# Altium footprint library PcbLib_ICs.PcbLib: 317 footprints (part 16 of 24) (continued)
## SLP2510P8 [mm] "Package for RClamp0524P"
height 0.43
pads (10):
  rect 0.675x0.25 smd paste+0 mask+0.02: 1(-0.437,1)
  rrect30% 0.675x0.25 smd paste+0 mask+0.02: 2(-0.437,0.5) 4(-0.437,-0.5) 5(-0.437,-1) 6(0.437,-1) 7(0.437,-0.5) 9(0.437,0.5) 10(0.437,1)
  rrect30% 0.675x0.4 smd paste+0 mask+0.02: 3(-0.437,0) 8(0.437,0)
Top Overlay:
  circle w0.2: c-1.092,1 r0.1
  lines w0.2: -0.5,-1.4 0.5,-1.4 ; -0.5,1.4 0.5,1.4
Top Solder:
  region: -0.15,0.22 0.15,0.22 0.15,-0.22 -0.15,-0.22
Top Assy:
  circle w0.05: c-0.33,1.08 r0.075
  lines w0.05: -0.5,-1.1 -0.51,-1.1 -0.51,-0.9 -0.5,-0.9 ; -0.5,-0.6 -0.51,-0.6 -0.51,-0.4 -0.5,-0.4 ; -0.5,-0.2 -0.51,-0.2 -0.51,0.2 -0.5,0.2 ; -0.5,0.4 -0.51,0.4 -0.51,0.6 -0.5,0.6 ; -0.5,0.9 -0.51,0.9 -0.51,1.1 -0.5,1.1 ; 0.5,-1.1 0.51,-1.1 0.51,-0.9 0.5,-0.9 ; 0.5,-0.6 0.51,-0.6 0.51,-0.4 0.5,-0.4 ; 0.5,-0.2 0.51,-0.2 0.51,0.2 0.5,0.2 ; 0.5,0.4 0.51,0.4 0.51,0.6 0.5,0.6 ; 0.5,0.9 0.51,0.9 0.51,1.1 0.5,1.1 ; -0.5,-1.25 0.5,-1.25 0.5,1.25 -0.5,1.25 -0.5,-1.25
  text ".Designator" at 0.233,-1.719 h1
Top Text:
  lines w0.1: -0.5,0 0.5,0 ; 0,-0.5 0,0.5
3D body "RClamp0524P.STEP": height 0.6, standoff 0.02, extent -0.51,-1.25 0.51,1.25

## SO8-HCPL [mm] "SO8-HCPL"
height 1.75
pads (8):
  rect 1.45x0.6 smd paste+0 mask+0.05: 1(-2.725,1.905)
  oval 1.45x0.6 smd paste+0 mask+0.05: 2(-2.725,0.635) 3(-2.725,-0.635) 4(-2.725,-1.905) 5(2.725,-1.905) 6(2.725,-0.635) 7(2.725,0.635) 8(2.725,1.905)
Top Overlay:
  circle w0.25: c-2.725,2.755 r0.125
  rectangle: -1.7,1.7 -0.9,2.5
  lines w0.2: -3.556,-1.27 -2.032,-1.27 ; -3.556,0 -2.032,0 ; -3.556,1.27 -2.032,1.27 ; -1.6,-2.5 1.6,-2.5 ; -1.6,2.5 1.6,2.5 ; 1.894,-1.27 3.418,-1.27 ; 1.894,0 3.418,0 ; 1.894,1.27 3.418,1.27
Top Assy:
  drawing of 332 lines, arcs and shapes, not listed
  text ".Designator" at 0.467,-3.443 h2
Top Text:
  lines w0.05: -3.7,-2.75 -3.7,2.75 3.7,2.75 3.7,-2.75 -3.7,-2.75
  lines w0.1: -0.5,0 0.5,0 ; 0,-0.5 0,0.5
3D body "User Library-SO8-HCPL.STEP": height 3.33, standoff -0.4, extent -3.003,-2.5 3.003,2.5

## SO-16W [mm] "SOIC, 16-Leads, Body 10.29x7.49mm, Pitch 1.27mm, IPC Medium Density"
height 2.64
pads (16):
  rect 2.1x0.7 smd paste+0 mask+0.05: 1(-4.75,4.445)
  oval 2.1x0.7 smd paste+0 mask+0.05: 2(-4.75,3.175) 3(-4.75,1.905) 4(-4.75,0.635) 5(-4.75,-0.635) 6(-4.75,-1.905) 7(-4.75,-3.175) 8(-4.75,-4.445) 9(4.75,-4.445) 10(4.75,-3.175) 11(4.75,-1.905) 12(4.75,-0.635) 13(4.75,0.635) 14(4.75,1.905) 15(4.75,3.175) 16(4.75,4.445)
Top Overlay:
  circle w0.25: c-4.75,5.295 r0.125
  rectangle: -3.4,4.45 -2.6,5.25
  lines w0.2: -5.842,-3.81 -3.4,-3.81 ; -5.842,-2.54 -3.4,-2.54 ; -5.842,-1.27 -3.4,-1.27 ; -5.842,0 -3.4,0 ; -5.842,1.27 -3.4,1.27 ; -5.842,2.54 -3.4,2.54 ; -5.842,3.81 -3.4,3.81 ; 3.4,-3.81 5.842,-3.81 ; 3.4,-2.54 5.842,-2.54 ; 3.4,-1.27 5.842,-1.27 ; 3.4,0 5.842,0 ; 3.4,1.27 5.842,1.27 ; 3.4,2.54 5.842,2.54 ; 3.4,3.81 5.842,3.81 ; -3.4,-5.25 -3.4,5.25 3.4,5.25 3.4,-5.25 -3.4,-5.25
Top Assy:
  drawing of 223 lines, arcs and shapes, not listed
  text ".Designator" at 0.467,-3.443 h2
Top Text:
  lines w0.05: -5.925,-5.5 -5.925,5.5 5.925,5.5 5.925,-5.5 -5.925,-5.5
  lines w0.1: -0.5,0 0.5,0 ; 0,-0.5 0,0.5
3D body "User Library-SO-16W.STEP": height 2.48, standoff 0, extent -5.155,-5.165 5.155,5.165

## SOIC-8 [mm] "SOIC-8 package"
height 1.75
pads (8):
  rect 1.45x0.6 smd paste+0 mask+0.05: 1(-2.725,1.905)
  oval 1.45x0.6 smd paste+0 mask+0.05: 2(-2.725,0.635) 3(-2.725,-0.635) 4(-2.725,-1.905) 5(2.725,-1.905) 6(2.725,-0.635) 7(2.725,0.635) 8(2.725,1.905)
Top Overlay:
  circle w0.25: c-2.725,2.755 r0.125
  rectangle: -1.7,1.7 -0.9,2.5
  lines w0.2: -3.556,-1.27 -1.601,-1.27 ; -3.556,0 -1.601,0 ; -3.556,1.27 -1.601,1.27 ; 1.601,-1.27 3.556,-1.27 ; 1.601,0 3.556,0 ; 1.601,1.27 3.556,1.27 ; -1.6,-2.5 -1.6,2.5 1.6,2.5 1.6,-2.5 -1.6,-2.5
Top Assy:
  circle w0.05: c-1.225,1.784 r0.216
  lines w0.05: -2.889,-2.121 -2.502,-2.121 ; -2.889,-2.121 -2.889,-1.715 ; -2.889,-2.121 -2.889,-1.715 ; -2.889,-2.121 -1.867,-2.121 ; -2.889,-1.715 -2.502,-1.715 ; -2.889,-1.715 -1.867,-1.715 ; -2.889,-0.851 -2.502,-0.851 ; -2.889,-0.851 -2.889,-0.445 ; -2.889,-0.851 -2.889,-0.445 ; -2.889,-0.851 -1.867,-0.851 ; -2.889,-0.445 -2.502,-0.445 ; -2.889,-0.445 -1.867,-0.445 ; -2.889,0.419 -2.502,0.419 ; -2.889,0.419 -2.889,0.826 ; -2.889,0.419 -2.889,0.826 ; -2.889,0.419 -1.867,0.419 ; -2.889,0.826 -2.502,0.825 ; -2.889,0.826 -1.867,0.825 ; -2.889,1.689 -2.502,1.689 ; -2.889,1.689 -2.889,2.095 ; -2.889,1.689 -2.889,2.095 ; -2.889,1.689 -1.867,1.689 ; -2.889,2.095 -2.502,2.095 ; -2.889,2.095 -1.867,2.095 ; -2.502,-2.121 -2.502,-1.715 ; -2.502,-2.121 -2.261,-2.121 ; -2.502,-1.715 -2.261,-1.715 ; -2.502,-0.851 -2.502,-0.445 ; -2.502,-0.851 -2.261,-0.851 ; -2.502,-0.445 -2.261,-0.445 ; -2.502,0.419 -2.502,0.825 ; -2.502,0.419 -2.261,0.419 ; -2.502,0.825 -2.261,0.826 ; -2.502,1.689 -2.502,2.095 ; -2.502,1.689 -2.261,1.689 ; -2.502,2.095 -2.261,2.095 ; -2.261,-2.121 -2.261,-1.715 ; -2.261,-2.121 -2.019,-2.121 ; -2.261,-1.715 -2.019,-1.715 ; -2.261,-0.851 -2.261,-0.445 ; -2.261,-0.851 -2.019,-0.851 ; -2.261,-0.445 -2.019,-0.445 ; -2.261,0.419 -2.261,0.826 ; -2.261,0.419 -2.019,0.419 ; -2.261,0.826 -2.019,0.825 ; -2.261,1.689 -2.261,2.095 ; -2.261,1.689 -2.019,1.689 ; -2.261,2.095 -2.019,2.095 ; -2.019,-2.121 -2.019,-1.715 ; -2.019,-2.121 -1.867,-2.121 ; -2.019,-1.715 -1.867,-1.715 ; -2.019,-0.851 -2.019,-0.445 ; -2.019,-0.851 -1.867,-0.851 ; -2.019,-0.445 -1.867,-0.445 ; -2.019,0.419 -2.019,0.825 ; -2.019,0.419 -1.867,0.419 ; -2.019,0.825 -1.867,0.825 ; -2.019,1.689 -2.019,2.095 ; -2.019,1.689 -1.867,1.689 ; -2.019,2.095 -1.867,2.095 ; -1.867,-2.451 1.867,-2.451 ; -1.867,-2.451 -1.682,-2.266 ; -1.867,-2.451 -1.867,2.451 ; -1.867,-2.451 -1.867,-2.121 ; -1.867,-2.451 1.867,-2.451 ; -1.867,-1.715 -1.867,-0.851 ; -1.867,-0.445 -1.867,0.419 ; -1.867,0.825 -1.867,1.689 ; -1.867,2.095 -1.867,2.451 ; -1.867,2.451 1.867,2.451 ; -1.867,2.451 -1.682,2.266 ; -1.867,2.451 1.867,2.451 ; -1.682,-2.266 1.682,-2.266 ; -1.682,-2.266 -1.682,2.266 ; -1.682,2.266 1.682,2.266 ; 1.682,-2.266 1.867,-2.451 ; 1.682,-2.266 1.682,2.266 ; 1.682,2.266 1.867,2.451 ; 1.867,-2.451 1.867,2.451 ; 1.867,-2.451 1.867,-2.121 ; 1.867,-2.121 2.019,-2.121 ; 1.867,-2.121 2.889,-2.121 ; 1.867,-1.715 2.019,-1.715 ; 1.867,-1.715 2.889,-1.715 ; 1.867,-1.715 1.867,-0.851 ; 1.867,-0.851 2.019,-0.851 ; 1.867,-0.851 2.889,-0.851 ; 1.867,-0.445 2.019,-0.445 ; 1.867,-0.445 2.889,-0.445 ; 1.867,-0.445 1.867,0.419 ; 1.867,0.419 2.019,0.419 ; 1.867,0.419 2.889,0.419 ; 1.867,0.825 2.019,0.826 ; 1.867,0.825 2.889,0.825 ; 1.867,0.825 1.867,1.689 ; 1.867,1.689 2.019,1.689 ; 1.867,1.689 2.889,1.689 ; 1.867,2.095 2.019,2.095 ; 1.867,2.095 2.889,2.095 ; 1.867,2.095 1.867,2.451 ; 2.019,-2.121 2.019,-1.715 ; 2.019,-2.121 2.261,-2.121 ; 2.019,-1.715 2.261,-1.715 ; 2.019,-0.851 2.019,-0.445 ; 2.019,-0.851 2.261,-0.851 ; 2.019,-0.445 2.261,-0.445 ; 2.019,0.419 2.019,0.826 ; 2.019,0.419 2.261,0.419 ; 2.019,0.826 2.261,0.826 ; 2.019,1.689 2.019,2.095 ; 2.019,1.689 2.261,1.689 ; 2.019,2.095 2.261,2.095 ; 2.261,-2.121 2.502,-2.121 ; 2.261,-2.121 2.261,-1.715 ; 2.261,-1.715 2.502,-1.715 ; 2.261,-0.851 2.502,-0.851 ; 2.261,-0.851 2.261,-0.445 ; 2.261,-0.445 2.502,-0.445 ; 2.261,0.419 2.502,0.419 ; 2.261,0.419 2.261,0.826 ; 2.261,0.826 2.502,0.825 ; 2.261,1.689 2.502,1.689 ; 2.261,1.689 2.261,2.095 ; 2.261,2.095 2.502,2.095 ; 2.502,-2.121 2.502,-1.715 ; 2.502,-2.121 2.889,-2.121 ; 2.502,-1.715 2.889,-1.715 ; 2.502,-0.851 2.502,-0.445 ; 2.502,-0.851 2.889,-0.851 ; 2.502,-0.445 2.889,-0.445 ; 2.502,0.419 2.502,0.825 ; 2.502,0.419 2.889,0.419 ; 2.502,0.825 2.889,0.825 ; 2.502,1.689 2.502,2.095 ; 2.502,1.689 2.889,1.689 ; 2.502,2.095 2.889,2.095 ; 2.889,-2.121 2.889,-1.715 ; 2.889,-2.121 2.889,-1.715 ; 2.889,-0.851 2.889,-0.445 ; 2.889,-0.851 2.889,-0.445 ; 2.889,0.419 2.889,0.825 ; 2.889,0.419 2.889,0.825 ; 2.889,1.689 2.889,2.095 ; 2.889,1.689 2.889,2.095
  text ".Designator" at 0.467,-3.443 h2
Top Text:
  lines w0.05: -3.7,-2.75 3.7,-2.75 3.7,2.75 -3.7,2.75 -3.7,-2.75
  lines w0.1: -0.5,0 0.5,0 ; 0,-0.5 0,0.5
3D body "User Library-SOIC-8-1.step": height 1.75, standoff 0, extent -3,-2.45 3,2.45

## SOIC-8-WIDE [mm] "SOIC, 8-Leads, Body 4.50x4.50mm, Pitch 1.27mm, Thermal Pad 4.20x4.20mm, IPC Medium Density"
height 1.77
pads (8):
  rect 1.5x0.6 smd paste+0 mask+0.05: 1(-3.925,1.9)
  oval 1.5x0.6 smd paste+0 mask+0.05: 2(-3.925,0.63) 3(-3.925,-0.64) 4(-3.925,-1.91) 5(3.943,-1.91) 6(3.943,-0.64) 7(3.943,0.63) 8(3.943,1.9)
Top Overlay:
  circle w0.25: c-4.175,2.755 r0.125
  rectangle: -2.5,1.7 -1.7,2.5
  lines w0.2: -4.7,-1.275 -2.9,-1.275 ; -4.7,-0.005 -2.9,-0.005 ; -4.7,1.265 -2.9,1.265 ; -3,-2.475 -3,-3 3,-3 3,-2.475 ; -3,2.475 -3,3 3,3 3,2.475 ; 2.918,-1.275 4.718,-1.275 ; 2.918,-0.005 4.718,-0.005 ; 2.918,1.265 4.718,1.265
Top Assy:
  drawing of 152 lines, arcs and shapes, not listed
  text ".Designator" at 0.467,-3.443 h2
Top Text:
  lines w0.1: -0.5,0 0.5,0 ; 0,-0.5 0,0.5
3D body "User Library-SOIC8_Wide_5mmx5mm.step": height 1.75, standoff -0.01, extent -4.005,-2.74 4.097,2.72

## SOIC-8-WIDE_WITH_SOIC-16N [mm] "SOIC, 8-Leads, Body 4.50x4.50mm, Pitch 1.27mm, Thermal Pad 4.20x4.20mm, IPC Medium Density with SOIC 16-Leads, Body 10.29x7.49mm, Pitch 1.27mm, IPC Medium Density"
height 2.64
pads (24):
  oval 1.9x0.6 smd paste+0 mask+0.05: 1(-4.75,-3.175) 2(-4.75,-4.445) 3(4.75,-4.445) 4(4.75,-3.175) 5(4.75,3.175) 6(4.75,4.445) 8(-4.75,3.175) DNU(-4.75,-1.905) DNU(-4.75,-0.635) DNU(-4.75,0.635) DNU(-4.75,1.905) DNU(4.75,-1.905) DNU(4.75,-0.635) DNU(4.75,0.635) DNU(4.75,1.905)
  rect 0.6x1.5 smd paste+0 mask+0.05: 1(-1.9,-3.925)
  oval 0.6x1.5 smd paste+0 mask+0.05: 2(-0.63,-3.925) 3(0.64,-3.925) 4(1.91,-3.925) 5(1.91,3.943) 6(0.64,3.943) 7(-0.63,3.943) 8(-1.9,3.943)
  rect 1.9x0.6 smd paste+0 mask+0.05: 7(-4.75,4.445)
Top Overlay:
  circle w0.25: c-2.755,-4.175 r0.125
  circle w0.25: c-4.75,5.295 r0.125
  rectangle: -3.4,4.45 -2.6,5.25
  region: -2.4,-3 -2.4,-2.4 -3,-2.4 -3,-3
  lines w0.2: -5.65,-3.81 -3.4,-3.81 ; -5.65,-2.54 -3.4,-2.54 ; -5.65,-1.27 -3.4,-1.27 ; -5.65,0 -3.4,0 ; -5.65,1.27 -3.4,1.27 ; -5.65,2.54 -3.4,2.54 ; -5.65,3.81 -3.4,3.81 ; -2.475,-3 -3,-3 -3,3 -2.475,3 ; -1.265,-4.7 -1.265,-2.9 ; -1.265,2.918 -1.265,4.718 ; 0.005,-4.7 0.005,-2.9 ; 0.005,2.918 0.005,4.718 ; 1.275,-4.7 1.275,-2.9 ; 1.275,2.918 1.275,4.718 ; 2.475,-3 3,-3 3,3 2.475,3 ; 3.4,-3.81 5.65,-3.81 ; 3.4,-2.54 5.65,-2.54 ; 3.4,-1.27 5.65,-1.27 ; 3.4,0 5.65,0 ; 3.4,1.27 5.65,1.27 ; 3.4,2.54 5.65,2.54 ; 3.4,3.81 5.65,3.81 ; -3.4,-5.25 3.4,-5.25 3.4,5.25 -3.4,5.25 -3.4,-5.25
Top Assy:
  drawing of 365 lines, arcs and shapes, not listed
  text ".Designator" at -3.443,-0.467 h2
Top Text:
  lines w0.05: -5.925,-5.5 5.925,-5.5 5.925,5.5 -5.925,5.5 -5.925,-5.5
  lines w0.1: -0.5,0 0.5,0 -0.5,0 ; 0,-0.5 0,0.5 0,-0.5
3D body "User Library-SOIC8_Wide_5mmx5mm.step": height 1.75, standoff -0.01, extent -2.72,-4.005 2.74,4.097

## SOIC-8_with_DIP-8 [mm] "Plastic DIP, 8 pin, lead pitch 2.54mm (0.1\"), row spacing 7.62mm (0.3\")."
height 1.75
pads (16):
  rect 2x1.5 hole 0.8 mask+0.075: 1(-3.81,3.81)
  rect 0.6x1.45 smd paste+0 mask+0.05: 1(1.905,2.725)
  oval 2x1.5 hole 0.8 mask+0.075: 2(-3.81,1.27) 3(-3.81,-1.27) 4(-3.81,-3.81) 5(3.81,-3.81) 6(3.81,-1.27) 7(3.81,1.27) 8(3.81,3.81)
  oval 0.6x1.45 smd paste+0 mask+0.05: 2(0.635,2.725) 3(-0.635,2.725) 4(-1.905,2.725) 5(-1.905,-2.725) 6(-0.635,-2.725) 7(0.635,-2.725) 8(1.905,-2.725)
Top Overlay:
  circle w0.25: c2.755,2.725 r0.125
  circle w0.6: c-4,5.75 r0.3
  region: 1.45,1.6 1.45,0.8 2.25,0.8 2.25,1.6
  lines w0.2: -2.2,-3.8 -2.2,-4.8 2.2,-4.8 2.2,-3.8 ; -2.2,3.8 -2.2,4.8 2.2,4.8 2.2,3.8 ; -1.27,-3.403 -1.27,-1.603 ; -1.27,1.603 -1.27,3.403 ; -1.016,4.8 ccw(c0,4.8) 1.016,4.8 ; 0,-3.403 0,-1.603 ; 0,1.603 0,3.403 ; 1.27,-3.403 1.27,-1.603 ; 1.27,1.603 1.27,3.403 ; -2.25,-1.6 2.25,-1.6 2.25,1.6 -2.25,1.6 -2.25,-1.6
Top Assy:
  circle w0.05: c1.784,1.225 r0.216
  lines w0.05: -2.451,-1.867 -2.451,1.867 ; -2.451,-1.867 -2.266,-1.682 ; -2.451,-1.867 2.451,-1.867 ; -2.451,-1.867 -2.451,1.867 ; -2.451,-1.867 -2.121,-1.867 ; -2.451,1.867 -2.266,1.682 ; -2.451,1.867 2.451,1.867 ; -2.451,1.867 -2.121,1.867 ; -2.266,-1.682 -2.266,1.682 ; -2.266,-1.682 2.266,-1.682 ; -2.266,1.682 2.266,1.682 ; -2.121,-2.889 -2.121,-2.502 ; -2.121,-2.889 -1.715,-2.889 ; -2.121,-2.889 -2.121,-1.867 ; -2.121,-2.889 -1.715,-2.889 ; -2.121,-2.502 -1.715,-2.502 ; -2.121,-2.502 -2.121,-2.261 ; -2.121,-2.261 -2.121,-2.019 ; -2.121,-2.261 -1.715,-2.261 ; -2.121,-2.019 -1.715,-2.019 ; -2.121,-2.019 -2.121,-1.867 ; -2.121,1.867 -2.121,2.019 ; -2.121,1.867 -2.121,2.889 ; -2.121,2.019 -1.715,2.019 ; -2.121,2.019 -2.121,2.261 ; -2.121,2.261 -2.121,2.502 ; -2.121,2.261 -1.715,2.261 ; -2.121,2.502 -1.715,2.502 ; -2.121,2.502 -2.121,2.889 ; -2.121,2.889 -1.715,2.889 ; -2.121,2.889 -1.715,2.889 ; -1.715,-2.889 -1.715,-2.502 ; -1.715,-2.889 -1.715,-1.867 ; -1.715,-2.502 -1.715,-2.261 ; -1.715,-2.261 -1.715,-2.019 ; -1.715,-2.019 -1.715,-1.867 ; -1.715,-1.867 -0.851,-1.867 ; -1.715,1.867 -1.715,2.019 ; -1.715,1.867 -0.851,1.867 ; -1.715,1.867 -1.715,2.889 ; -1.715,2.019 -1.715,2.261 ; -1.715,2.261 -1.715,2.502 ; -1.715,2.502 -1.715,2.889 ; -0.851,-2.889 -0.851,-2.502 ; -0.851,-2.889 -0.445,-2.889 ; -0.851,-2.889 -0.445,-2.889 ; -0.851,-2.889 -0.851,-1.867 ; -0.851,-2.502 -0.445,-2.502 ; -0.851,-2.502 -0.851,-2.261 ; -0.851,-2.261 -0.851,-2.019 ; -0.851,-2.261 -0.445,-2.261 ; -0.851,-2.019 -0.445,-2.019 ; -0.851,-2.019 -0.851,-1.867 ; -0.851,1.867 -0.851,2.019 ; -0.851,1.867 -0.851,2.889 ; -0.851,2.019 -0.445,2.019 ; -0.851,2.019 -0.851,2.261 ; -0.851,2.261 -0.851,2.502 ; -0.851,2.261 -0.445,2.261 ; -0.851,2.502 -0.445,2.502 ; -0.851,2.502 -0.851,2.889 ; -0.851,2.889 -0.445,2.889 ; -0.851,2.889 -0.445,2.889 ; -0.445,-2.889 -0.445,-2.502 ; -0.445,-2.889 -0.445,-1.867 ; -0.445,-2.502 -0.445,-2.261 ; -0.445,-2.261 -0.445,-2.019 ; -0.445,-2.019 -0.445,-1.867 ; -0.445,-1.867 0.419,-1.867 ; -0.445,1.867 -0.445,2.019 ; -0.445,1.867 0.419,1.867 ; -0.445,1.867 -0.445,2.889 ; -0.445,2.019 -0.445,2.261 ; -0.445,2.261 -0.445,2.502 ; -0.445,2.502 -0.445,2.889 ; 0.419,-2.889 0.419,-2.502 ; 0.419,-2.889 0.825,-2.889 ; 0.419,-2.889 0.419,-1.867 ; 0.419,-2.889 0.825,-2.889 ; 0.419,-2.502 0.825,-2.502 ; 0.419,-2.502 0.419,-2.261 ; 0.419,-2.261 0.419,-2.019 ; 0.419,-2.261 0.825,-2.261 ; 0.419,-2.019 0.825,-2.019 ; 0.419,-2.019 0.419,-1.867 ; 0.419,1.867 0.419,2.019 ; 0.419,1.867 0.419,2.889 ; 0.419,2.019 0.825,2.019 ; 0.419,2.019 0.419,2.261 ; 0.419,2.261 0.419,2.502 ; 0.419,2.261 0.825,2.261 ; 0.419,2.502 0.825,2.502 ; 0.419,2.502 0.419,2.889 ; 0.419,2.889 0.825,2.889 ; 0.419,2.889 0.825,2.889 ; 0.825,-2.889 0.825,-2.502 ; 0.825,-2.889 0.825,-1.867 ; 0.825,-2.502 0.825,-2.261 ; 0.825,-2.261 0.825,-2.019 ; 0.825,-2.019 0.825,-1.867 ; 0.825,-1.867 1.689,-1.867 ; 0.825,1.867 0.825,2.019 ; 0.825,1.867 1.689,1.867 ; 0.825,1.867 0.825,2.889 ; 0.825,2.019 0.825,2.261 ; 0.825,2.261 0.825,2.502 ; 0.825,2.502 0.825,2.889 ; 1.689,-2.889 1.689,-2.502 ; 1.689,-2.889 2.095,-2.889 ; 1.689,-2.889 2.095,-2.889 ; 1.689,-2.889 1.689,-1.867 ; 1.689,-2.502 2.095,-2.502 ; 1.689,-2.502 1.689,-2.261 ; 1.689,-2.261 1.689,-2.019 ; 1.689,-2.261 2.095,-2.261 ; 1.689,-2.019 2.095,-2.019 ; 1.689,-2.019 1.689,-1.867 ; 1.689,1.867 1.689,2.019 ; 1.689,1.867 1.689,2.889 ; 1.689,2.019 2.095,2.019 ; 1.689,2.019 1.689,2.261 ; 1.689,2.261 1.689,2.502 ; 1.689,2.261 2.095,2.261 ; 1.689,2.502 2.095,2.502 ; 1.689,2.502 1.689,2.889 ; 1.689,2.889 2.095,2.889 ; 1.689,2.889 2.095,2.889 ; 2.095,-2.889 2.095,-2.502 ; 2.095,-2.889 2.095,-1.867 ; 2.095,-2.502 2.095,-2.261 ; 2.095,-2.261 2.095,-2.019 ; 2.095,-2.019 2.095,-1.867 ; 2.095,-1.867 2.451,-1.867 ; 2.095,1.867 2.095,2.019 ; 2.095,1.867 2.451,1.867 ; 2.095,1.867 2.095,2.889 ; 2.095,2.019 2.095,2.261 ; 2.095,2.261 2.095,2.502 ; 2.095,2.502 2.095,2.889 ; 2.266,-1.682 2.266,1.682 ; 2.266,-1.682 2.451,-1.867 ; 2.266,1.682 2.451,1.867 ; 2.451,-1.867 2.451,1.867 ; 2.451,-1.867 2.451,1.867
  text ".Designator" at -3.443,-0.467 h2
Top Text:
  lines w0.05: -5.334,-5 5.334,-5 5.334,5 -5.334,5 -5.334,-5
  lines w0.1: -0.5,0 0.5,0 ; 0,-0.5 0,0.5
3D body "User Library-SOIC-8-1.step": height 1.75, standoff 0, extent -2.45,-3 2.45,3

## SOIC-8EP [mm] "SOIC-8 package with exponsed pad"
height 1.75
pads (9):
  rect 1.45x0.6 smd paste+0 mask+0.05: 1(-2.725,1.905)
  oval 1.45x0.6 smd paste+0 mask+0.05: 2(-2.725,0.635) 3(-2.725,-0.635) 4(-2.725,-1.905) 5(2.725,-1.905) 6(2.725,-0.635) 7(2.725,0.635) 8(2.725,1.905)
  rrect10% 2.56x3.45 smd paste-50 mask+0.05: EP(0,0)
Top Overlay:
  circle w0.25: c-2.725,2.755 r0.125
  lines w0.2: -3.5,-1.27 -1.7,-1.27 ; -3.5,0 -1.7,0 ; -3.5,1.27 -1.7,1.27 ; 1.7,-1.27 3.5,-1.27 ; 1.7,0 3.5,0 ; 1.7,1.27 3.5,1.27 ; -1.7,-2.5 1.7,-2.5 1.7,2.5 -1.7,2.5 -1.7,-2.5
Top Paste:
  region: -0.8,-1.15 -1.3,-1.15 -1.3,-1.65 -0.8,-1.65
  region: 0.6,-1.15 0.1,-1.15 0.1,-1.65 0.6,-1.65
  rectangle: -0.6,-1.65 -0.1,-1.15
  region: 1.3,-1.15 0.8,-1.15 0.8,-1.65 1.3,-1.65
  region: -0.8,-0.45 -1.3,-0.45 -1.3,-0.95 -0.8,-0.95
  region: 0.6,-0.45 0.1,-0.45 0.1,-0.95 0.6,-0.95
  rectangle: -0.6,-0.95 -0.1,-0.45
  region: 1.3,-0.45 0.8,-0.45 0.8,-0.95 1.3,-0.95
  rectangle: 0.8,1.15 1.3,1.65
  rectangle: -0.6,1.15 -0.1,1.65
  region: 0.6,1.65 0.1,1.65 0.1,1.15 0.6,1.15
  rectangle: -1.3,1.15 -0.8,1.65
  rectangle: 0.8,0.45 1.3,0.95
  rectangle: -0.6,0.45 -0.1,0.95
  region: 0.6,0.95 0.1,0.95 0.1,0.45 0.6,0.45
  rectangle: -1.3,0.45 -0.8,0.95
  rectangle: 0.8,-0.25 1.3,0.25
  rectangle: -0.6,-0.25 -0.1,0.25
  region: 0.6,0.25 0.1,0.25 0.1,-0.25 0.6,-0.25
  rectangle: -1.3,-0.25 -0.8,0.25
Top Assy:
  circle w0.05: c-1.225,1.784 r0.216
  lines w0.05: -2.889,-2.121 -1.867,-2.121 ; -2.889,-2.121 -2.889,-1.715 ; -2.889,-2.121 -2.889,-1.715 ; -2.889,-2.121 -2.502,-2.121 ; -2.889,-1.715 -1.867,-1.715 ; -2.889,-1.715 -2.502,-1.715 ; -2.889,-0.851 -1.867,-0.851 ; -2.889,-0.851 -2.889,-0.445 ; -2.889,-0.851 -2.889,-0.445 ; -2.889,-0.851 -2.502,-0.851 ; -2.889,-0.445 -1.867,-0.445 ; -2.889,-0.445 -2.502,-0.445 ; -2.889,0.419 -1.867,0.419 ; -2.889,0.419 -2.889,0.826 ; -2.889,0.419 -2.889,0.826 ; -2.889,0.419 -2.502,0.419 ; -2.889,0.826 -1.867,0.825 ; -2.889,0.826 -2.502,0.825 ; -2.889,1.689 -1.867,1.689 ; -2.889,1.689 -2.889,2.095 ; -2.889,1.689 -2.889,2.095 ; -2.889,1.689 -2.502,1.689 ; -2.889,2.095 -1.867,2.095 ; -2.889,2.095 -2.502,2.095 ; -2.502,-2.121 -2.261,-2.121 ; -2.502,-2.121 -2.502,-1.715 ; -2.502,-1.715 -2.261,-1.715 ; -2.502,-0.851 -2.261,-0.851 ; -2.502,-0.851 -2.502,-0.445 ; -2.502,-0.445 -2.261,-0.445 ; -2.502,0.419 -2.261,0.419 ; -2.502,0.419 -2.502,0.825 ; -2.502,0.825 -2.261,0.826 ; -2.502,1.689 -2.261,1.689 ; -2.502,1.689 -2.502,2.095 ; -2.502,2.095 -2.261,2.095 ; -2.261,-2.121 -2.019,-2.121 ; -2.261,-2.121 -2.261,-1.715 ; -2.261,-1.715 -2.019,-1.715 ; -2.261,-0.851 -2.019,-0.851 ; -2.261,-0.851 -2.261,-0.445 ; -2.261,-0.445 -2.019,-0.445 ; -2.261,0.419 -2.019,0.419 ; -2.261,0.419 -2.261,0.826 ; -2.261,0.826 -2.019,0.825 ; -2.261,1.689 -2.019,1.689 ; -2.261,1.689 -2.261,2.095 ; -2.261,2.095 -2.019,2.095 ; -2.019,-2.121 -1.867,-2.121 ; -2.019,-2.121 -2.019,-1.715 ; -2.019,-1.715 -1.867,-1.715 ; -2.019,-0.851 -1.867,-0.851 ; -2.019,-0.851 -2.019,-0.445 ; -2.019,-0.445 -1.867,-0.445 ; -2.019,0.419 -1.867,0.419 ; -2.019,0.419 -2.019,0.825 ; -2.019,0.825 -1.867,0.825 ; -2.019,1.689 -1.867,1.689 ; -2.019,1.689 -2.019,2.095 ; -2.019,2.095 -1.867,2.095 ; -1.867,-2.451 1.867,-2.451 ; -1.867,-2.451 -1.867,-2.121 ; -1.867,-2.451 -1.867,2.451 ; -1.867,-2.451 -1.682,-2.266 ; -1.867,-2.451 1.867,-2.451 ; -1.867,-1.715 -1.867,-0.851 ; -1.867,-0.445 -1.867,0.419 ; -1.867,0.825 -1.867,1.689 ; -1.867,2.095 -1.867,2.451 ; -1.867,2.451 1.867,2.451 ; -1.867,2.451 -1.682,2.266 ; -1.867,2.451 1.867,2.451 ; -1.682,-2.266 -1.682,2.266 ; -1.682,-2.266 1.682,-2.266 ; -1.682,2.266 1.682,2.266 ; 1.682,-2.266 1.682,2.266 ; 1.682,-2.266 1.867,-2.451 ; 1.682,2.266 1.867,2.451 ; 1.867,-2.451 1.867,-2.121 ; 1.867,-2.451 1.867,2.451 ; 1.867,-2.121 2.889,-2.121 ; 1.867,-2.121 2.019,-2.121 ; 1.867,-1.715 1.867,-0.851 ; 1.867,-1.715 2.889,-1.715 ; 1.867,-1.715 2.019,-1.715 ; 1.867,-0.851 2.889,-0.851 ; 1.867,-0.851 2.019,-0.851 ; 1.867,-0.445 1.867,0.419 ; 1.867,-0.445 2.889,-0.445 ; 1.867,-0.445 2.019,-0.445 ; 1.867,0.419 2.889,0.419 ; 1.867,0.419 2.019,0.419 ; 1.867,0.825 1.867,1.689 ; 1.867,0.825 2.889,0.825 ; 1.867,0.825 2.019,0.826 ; 1.867,1.689 2.889,1.689 ; 1.867,1.689 2.019,1.689 ; 1.867,2.095 1.867,2.451 ; 1.867,2.095 2.889,2.095 ; 1.867,2.095 2.019,2.095 ; 2.019,-2.121 2.261,-2.121 ; 2.019,-2.121 2.019,-1.715 ; 2.019,-1.715 2.261,-1.715 ; 2.019,-0.851 2.261,-0.851 ; 2.019,-0.851 2.019,-0.445 ; 2.019,-0.445 2.261,-0.445 ; 2.019,0.419 2.261,0.419 ; 2.019,0.419 2.019,0.826 ; 2.019,0.826 2.261,0.826 ; 2.019,1.689 2.261,1.689 ; 2.019,1.689 2.019,2.095 ; 2.019,2.095 2.261,2.095 ; 2.261,-2.121 2.261,-1.715 ; 2.261,-2.121 2.502,-2.121 ; 2.261,-1.715 2.502,-1.715 ; 2.261,-0.851 2.261,-0.445 ; 2.261,-0.851 2.502,-0.851 ; 2.261,-0.445 2.502,-0.445 ; 2.261,0.419 2.261,0.826 ; 2.261,0.419 2.502,0.419 ; 2.261,0.826 2.502,0.825 ; 2.261,1.689 2.261,2.095 ; 2.261,1.689 2.502,1.689 ; 2.261,2.095 2.502,2.095 ; 2.502,-2.121 2.889,-2.121 ; 2.502,-2.121 2.502,-1.715 ; 2.502,-1.715 2.889,-1.715 ; 2.502,-0.851 2.889,-0.851 ; 2.502,-0.851 2.502,-0.445 ; 2.502,-0.445 2.889,-0.445 ; 2.502,0.419 2.889,0.419 ; 2.502,0.419 2.502,0.825 ; 2.502,0.825 2.889,0.825 ; 2.502,1.689 2.889,1.689 ; 2.502,1.689 2.502,2.095 ; 2.502,2.095 2.889,2.095 ; 2.889,-2.121 2.889,-1.715 ; 2.889,-2.121 2.889,-1.715 ; 2.889,-0.851 2.889,-0.445 ; 2.889,-0.851 2.889,-0.445 ; 2.889,0.419 2.889,0.825 ; 2.889,0.419 2.889,0.825 ; 2.889,1.689 2.889,2.095 ; 2.889,1.689 2.889,2.095
  text ".Designator" at 0.467,-3.443 h2
Top Text:
  lines w0.05: -3.7,-2.75 -3.7,2.75 3.7,2.75 3.7,-2.75 -3.7,-2.75
  lines w0.1: -0.5,0 0.5,0 ; 0,-0.5 0,0.5
3D body "User Library-SOIC-8-1.step": height 1.75, standoff 0, extent -3,-2.45 3,2.45

## SOIC-14 [mm] "package SOIC-14, 150 mil"
height 1.75
pads (14):
  rect 1.45x0.6 smd paste+0 mask+0.05: 1(-2.725,3.81)
  oval 1.45x0.6 smd paste+0 mask+0.05: 2(-2.725,2.54) 3(-2.725,1.27) 4(-2.725,0) 5(-2.725,-1.27) 6(-2.725,-2.54) 7(-2.725,-3.81) 8(2.725,-3.81) 9(2.725,-2.54) 10(2.725,-1.27) 11(2.725,0) 12(2.725,1.27) 13(2.725,2.54) 14(2.725,3.81)
Top Overlay:
  circle w0.25: c-2.725,4.66 r0.125
  rectangle: -1.6,3.565 -0.8,4.365
  lines w0.2: -3.4,-3.175 -1.6,-3.175 ; -3.4,-1.905 -1.6,-1.905 ; -3.4,-0.635 -1.6,-0.635 ; -3.4,0.635 -1.6,0.635 ; -3.4,1.905 -1.6,1.905 ; -3.4,3.175 -1.6,3.175 ; -1.6,-4.365 1.6,-4.365 ; -1.6,-4.35 -1.6,4.365 1.6,4.365 1.6,-4.35 ; 1.6,-3.175 3.4,-3.175 ; 1.6,-1.905 3.4,-1.905 ; 1.6,-0.635 3.4,-0.635 ; 1.6,0.635 3.4,0.635 ; 1.6,1.905 3.4,1.905 ; 1.6,3.175 3.4,3.175
Top Assy:
  drawing of 252 lines, arcs and shapes, not listed
  text ".Designator" at 0.467,-3.443 h2
Top Text:
  lines w0.05: -3.7,-4.5 -3.7,4.5 3.7,4.5 3.7,-4.5 -3.7,-4.5
  lines w0.1: -0.5,0 0.5,0 ; 0,-0.5 0,0.5
3D body "User Library-so14-2.step": height 1.73, standoff -0.04, extent -3.068,-4.35 3.069,4.35